# Altium footprint library connectors_socets.pcblib: 567 footprints (part 8 of 36)
Each footprint in its own frame and in the unit in brackets; x right, y up, seen from the top. Pads: shape width x height; smd on the part's side, far side on the other; paste and mask are expansions set on the pad; w line width, h text height; cw(c..) or ccw(c..) is an arc to the next point about the centre after c.
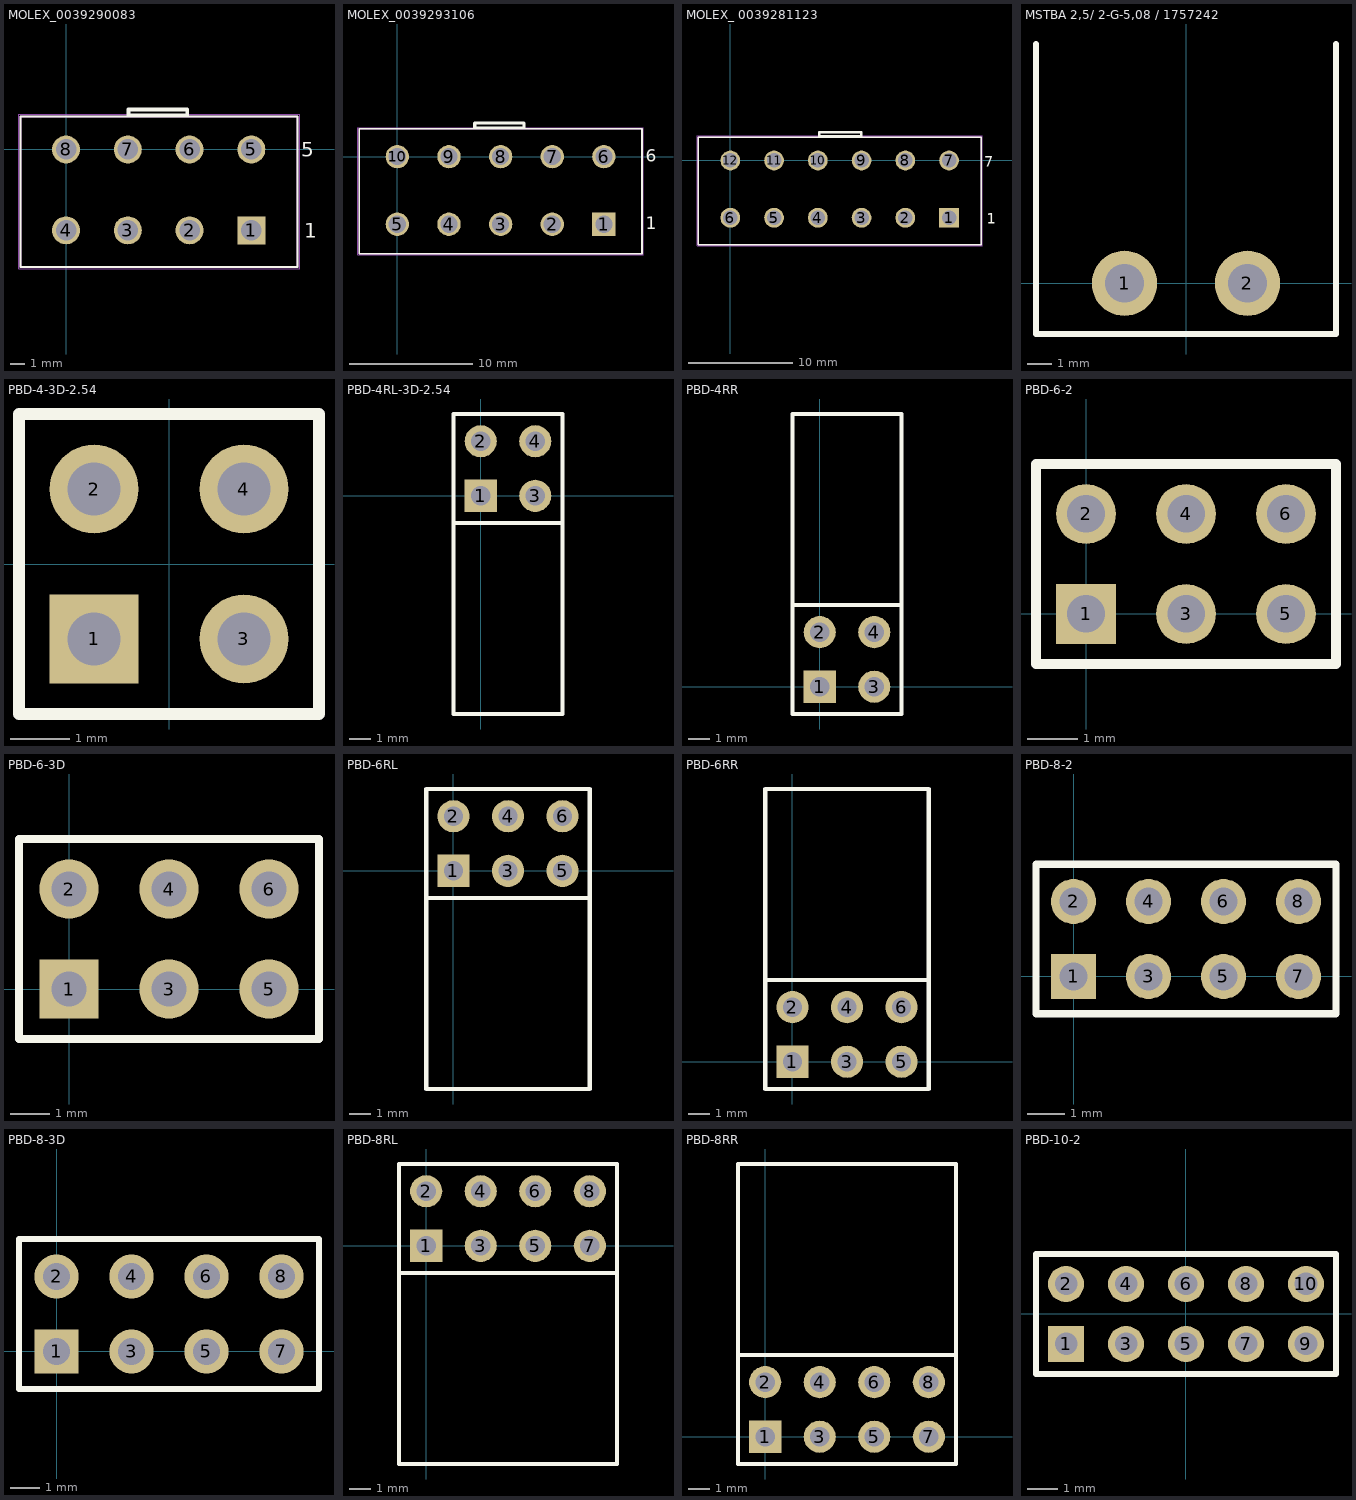
[diagram p7: the footprints below, top view; thin cyan lines are the x and y axes]

## MOLEX_0039290083 [mm]
height 12.8
pads (8):
  rect 1.9x1.9 / inner round 1.9 / far side rect 1.9x1.9 hole 1.4 mask+0.076: 1(12.6,-5.5)
  round 1.9 hole 1.4 mask+0.076: 2(8.4,-5.5) 3(4.2,-5.5) 4(0,-5.5) 5(12.6,0) 6(8.4,0) 7(4.2,0) 8(0,0)
Top Overlay:
  lines w0.127: -3.1,-8 -3.1,2.25 15.75,2.25 15.75,-8 -3.1,-8
  lines w0.254: 4.238,2.322 8.238,2.322 8.238,2.722 4.238,2.722 4.238,2.322
  text "5" at 16,-0.5 h1
  text "1" at 16.2,-6 h1
Plata3D:
  lines w0.127: -3.1,-8 -3.1,2.25 15.75,2.25 15.75,-8 -3.1,-8
Board3D:
  lines w0.05: -3.2,-8.1 15.882,-8.1 15.882,2.4 -3.2,2.4 -3.2,-8.1
3D body "0039290083.SLDPRT": height 12.8, standoff -3.5, extent -3.047,-7.75 15.75,3.25

## MOLEX_0039293106 [mm]
height 12.8
pads (10):
  rect 1.9x1.9 / inner round 1.9 / far side rect 1.9x1.9 hole 1.4 mask+0.076: 1(16.8,-5.5)
  round 1.9 hole 1.4 mask+0.076: 2(12.6,-5.5) 3(8.4,-5.5) 4(4.2,-5.5) 5(0,-5.5) 6(16.8,0) 7(12.6,0) 8(8.4,0) 9(4.2,0) 10(0,0)
Top Overlay:
  lines w0.127: -3.1,-7.9 19.9,-7.9 19.9,2.25 -3.1,2.25 -3.1,-7.9
  lines w0.254: 6.294,2.332 10.294,2.332 10.294,2.732 6.294,2.732 6.294,2.332
  text "6" at 20.2,-0.4 h1
  text "1" at 20.2,-5.9 h1
Plata3D:
  lines w0.127: -3.1,-7.9 19.9,-7.9 19.9,2.25 -3.1,2.25 -3.1,-7.9
Board3D:
  lines w0.05: -3.2,-8 20,-8 20,2.351 -3.2,2.351 -3.2,-8
3D body "0039293106.SLDPRT": height 12.8, standoff -3.5, extent -3.114,-7.648 19.883,3.352

## MOLEX_ 0039281123 [mm]
height 12.8
pads (12):
  rect 1.9x1.9 / inner round 1.9 / far side rect 1.9x1.9 hole 1.4 mask+0.076: 1(21,-5.5)
  round 1.9 hole 1.4 mask+0.076: 2(16.8,-5.5) 3(12.6,-5.5) 4(8.4,-5.5) 5(4.2,-5.5) 6(0,-5.5) 7(21,0) 8(16.8,0) 9(12.6,0) 10(8.4,0) 11(4.2,0) 12(0,0)
Top Overlay:
  lines w0.127: -3.1,-8.1 -3.1,2.25 24.1,2.25 24.1,-8.1 -3.1,-8.1
  lines w0.254: 8.553,2.318 12.553,2.318 12.553,2.718 8.553,2.718 8.553,2.318
  text "1" at 24.6,-6.1 h1
  text "7" at 24.4,-0.6 h1
Plata3D:
  lines w0.127: -3.1,-8.1 -3.1,2.25 24.1,2.25 24.1,-8.1 -3.1,-8.1
Board3D:
  lines w0.05: -3.2,-8.2 24.206,-8.2 24.206,2.351 -3.2,2.351 -3.2,-8.2
3D body "39-28-1123--3DModel-STEP-361473.STEP": height 12.8, standoff -3.5, extent -3.1,-7.8 24.097,3.2

## MSTBA 2,5/ 2-G-5,08 / 1757242 [mm]
pads (2):
  round 2.7 hole 1.6: 1(-2.54,0) 2(2.54,0)
Top Overlay:
  lines w0.254: -6.2,9.9 -6.2,-2.1 6.2,-2.1 6.2,9.9
3D body "pxc_1757242_06_MSTBA-2-5-2-G-5-08_3D.stp": height 8.65, standoff -3.45, extent -6.08,-2 6.08,10.002

## PBD-4-3D-2.54 [mm] "Connector; Header; 2x2 Position"
height 8
pads (4):
  rect 1.5x1.5 hole 0.9: 1(-1.27,-1.27)
  round 1.5 hole 0.9: 2(-1.27,1.27) 3(1.27,-1.27) 4(1.27,1.27)
Top Overlay:
  lines w0.2: -2.54,-2.54 2.54,-2.54 2.54,2.54 -2.54,2.54 -2.54,-2.54
3D body "PBD-2.stp": height 8.5, standoff -3.15, extent -2.54,-2.54 0,2.54
3D body "PBD-2.stp": height 8.5, standoff -3.15, extent 0,-2.54 2.54,2.54

## PBD-4RL-3D-2.54 [mm] "Connector; Header; 2x2 Position"
height 5
pads (4):
  rect 1.5x1.5 hole 0.9: 1(0,0)
  round 1.5 hole 0.9: 2(0,2.54) 3(2.54,0) 4(2.54,2.54)
Top Overlay:
  lines w0.2: -1.27,-1.27 -1.27,-10.16 3.81,-10.16 3.81,-1.27 ; -1.27,-1.27 3.81,-1.27 ; -1.27,-1.27 -1.27,3.81 3.81,3.81 3.81,-1.27
3D body "PBD-4R.step": height 5, standoff -3, extent -1.27,-10.16 3.81,2.84

## PBD-4RR [mm] "Connector; Header; 2x2 Position"
height 5
pads (4):
  rect 1.5x1.5 hole 0.9: 1(0,0)
  round 1.5 hole 0.9: 2(0,2.54) 3(2.54,0) 4(2.54,2.54)
Top Overlay:
  lines w0.2: -1.27,3.81 -1.27,-1.27 3.81,-1.27 3.81,3.81 ; -1.27,3.81 3.81,3.81 ; -1.27,3.81 -1.27,12.7 3.81,12.7 3.81,3.81
3D body "PBD-4R.step": height 5, standoff -3, extent -1.27,-0.3 3.81,12.7

## PBD-6-2 [mm] "Connector; Header; 3x2 Position"
height 4.5
pads (6):
  rect 1.2x1.2 hole 0.75: 1(0,0)
  round 1.2 hole 0.75: 2(0,2) 3(2,0) 4(2,2) 5(4,0) 6(4,2)
Top Overlay:
  lines w0.2: -1,-1 -1,3 5,3 5,-1 -1,-1
3D body "PBD2mm.stp": height 4.5, standoff -2.7, extent -1,-1 1,3
3D body "PBD2mm.stp": height 4.5, standoff -2.7, extent 1,-1 3,3
3D body "PBD2mm.stp": height 4.5, standoff -2.7, extent 3,-1 5,3

## PBD-6-3D [mm] "Connector; Header; 3x2 Position"
height 8
pads (6):
  rect 1.5x1.5 hole 0.9: 1(0,0)
  round 1.5 hole 0.9: 2(0,2.54) 3(2.54,0) 4(2.54,2.54) 5(5.08,0) 6(5.08,2.54)
Top Overlay:
  lines w0.2: -1.27,-1.27 -1.27,3.81 6.35,3.81 6.35,-1.27 -1.27,-1.27
3D body "PBD-2.stp": height 8.5, standoff -3.15, extent 3.81,-1.27 6.35,3.81
3D body "PBD-2.stp": height 8.5, standoff -3.15, extent -1.27,-1.27 1.27,3.81
3D body "PBD-2.stp": height 8.5, standoff -3.15, extent 1.27,-1.27 3.81,3.81

## PBD-6RL [mm] "Connector; Header; 3x2 Position"
height 5
pads (6):
  rect 1.5x1.5 hole 0.9: 1(0,0)
  round 1.5 hole 0.9: 2(0,2.54) 3(2.54,0) 4(2.54,2.54) 5(5.08,0) 6(5.08,2.54)
Top Overlay:
  lines w0.2: -1.27,-1.27 6.35,-1.27 ; -1.27,-1.27 -1.27,3.81 6.35,3.81 6.35,-1.27 ; -1.27,-1.27 -1.27,-10.16 6.35,-10.16 6.35,-1.27
3D body "PBD-6R.step": height 5, standoff -3, extent -1.27,-10.16 6.35,2.84

## PBD-6RR [mm] "Connector; Header; 3x2 Position"
height 5
pads (6):
  rect 1.5x1.5 hole 0.9: 1(0,0)
  round 1.5 hole 0.9: 2(0,2.54) 3(2.54,0) 4(2.54,2.54) 5(5.08,0) 6(5.08,2.54)
Top Overlay:
  lines w0.2: -1.27,3.81 -1.27,12.7 6.35,12.7 6.35,3.81 ; -1.27,3.81 -1.27,-1.27 6.35,-1.27 6.35,3.81 ; -1.27,3.81 6.35,3.81
3D body "PBD-6R.step": height 5, standoff -3, extent -1.27,-0.3 6.35,12.7

## PBD-8-2 [mm] "Connector; Header; 4x2 Position"
height 4.5
pads (8):
  rect 1.2x1.2 hole 0.75: 1(0,0)
  round 1.2 hole 0.75: 2(0,2) 3(2,0) 4(2,2) 5(4,0) 6(4,2) 7(6,0) 8(6,2)
Top Overlay:
  lines w0.2: -1,-1 7,-1 7,3 -1,3 -1,-1
3D body "PBD2mm.stp": height 4.5, standoff -2.7, extent -1,-1 1,3
3D body "PBD2mm.stp": height 4.5, standoff -2.7, extent 1,-1 3,3
3D body "PBD2mm.stp": height 4.5, standoff -2.7, extent 3,-1 5,3
3D body "PBD2mm.stp": height 4.5, standoff -2.7, extent 5,-1 7,3

## PBD-8-3D [mm] "Connector; Header; 4x2 Position"
height 8
pads (8):
  rect 1.5x1.5 hole 0.9: 1(0,0)
  round 1.5 hole 0.9: 2(0,2.54) 3(2.54,0) 4(2.54,2.54) 5(5.08,0) 6(5.08,2.54) 7(7.62,0) 8(7.62,2.54)
Top Overlay:
  lines w0.2: -1.27,-1.27 -1.27,3.81 8.89,3.81 8.89,-1.27 -1.27,-1.27
3D body "PBD-2.stp": height 8.5, standoff -3.15, extent -1.27,-1.27 1.27,3.81
3D body "PBD-2.stp": height 8.5, standoff -3.15, extent 1.27,-1.27 3.81,3.81
3D body "PBD-2.stp": height 8.5, standoff -3.15, extent 3.81,-1.27 6.35,3.81
3D body "PBD-2.stp": height 8.5, standoff -3.15, extent 6.35,-1.27 8.89,3.81

## PBD-8RL [mm] "Connector; Header; 4x2 Position"
height 5
pads (8):
  rect 1.5x1.5 hole 0.9: 1(0,0)
  round 1.5 hole 0.9: 2(0,2.54) 3(2.54,0) 4(2.54,2.54) 5(5.08,0) 6(5.08,2.54) 7(7.62,0) 8(7.62,2.54)
Top Overlay:
  lines w0.2: -1.27,-1.27 -1.27,-10.16 8.89,-10.16 8.89,-1.27 ; -1.27,-1.27 -1.27,3.81 8.89,3.81 8.89,-1.27 ; -1.27,-1.27 8.89,-1.27
3D body "PBD-8R.step": height 5, standoff -3, extent -1.27,-10.16 8.89,2.84

## PBD-8RR [mm] "Connector; Header; 4x2 Position"
height 5
pads (8):
  rect 1.5x1.5 hole 0.9: 1(0,0)
  round 1.5 hole 0.9: 2(0,2.54) 3(2.54,0) 4(2.54,2.54) 5(5.08,0) 6(5.08,2.54) 7(7.62,0) 8(7.62,2.54)
Top Overlay:
  lines w0.2: -1.27,3.81 8.89,3.81 ; -1.27,3.81 -1.27,-1.27 8.89,-1.27 8.89,3.81 ; -1.27,3.81 -1.27,12.7 8.89,12.7 8.89,3.81
3D body "PBD-8R.step": height 5, standoff -3, extent -1.27,-0.3 8.89,12.7

## PBD-10-2 [mm] "Connector; Header; 5x2 Position"
height 4.5
pads (10):
  rect 1.2x1.2 hole 0.75: 1(-3.984,-1)
  round 1.2 hole 0.75: 2(-3.984,1) 3(-1.984,-1) 4(-1.984,1) 5(0.016,-1) 6(0.016,1) 7(2.016,-1) 8(2.016,1) 9(4.016,-1) 10(4.016,1)
Top Overlay:
  lines w0.2: -4.984,-2 5.016,-2 5.016,2 -4.984,2 -4.984,-2
3D body "PBD2mm.stp": height 4.5, standoff -2.7, extent 3.016,-2 5.016,2
3D body "PBD2mm.stp": height 4.5, standoff -2.7, extent 1.016,-2 3.016,2
3D body "PBD2mm.stp": height 4.5, standoff -2.7, extent -0.984,-2 1.016,2
3D body "PBD2mm.stp": height 4.5, standoff -2.7, extent -2.984,-2 -0.984,2
3D body "PBD2mm.stp": height 4.5, standoff -2.7, extent -4.984,-2 -2.984,2